# Altium footprint library kalios.PcbLib: 404 footprints (part 6 of 26)
Each footprint in its own frame and in the unit in brackets; x right, y up, seen from the top. Pads: shape width x height; smd on the part's side, far side on the other; paste and mask are expansions set on the pad; w line width, h text height; cw(c..) or ccw(c..) is an arc to the next point about the centre after c.
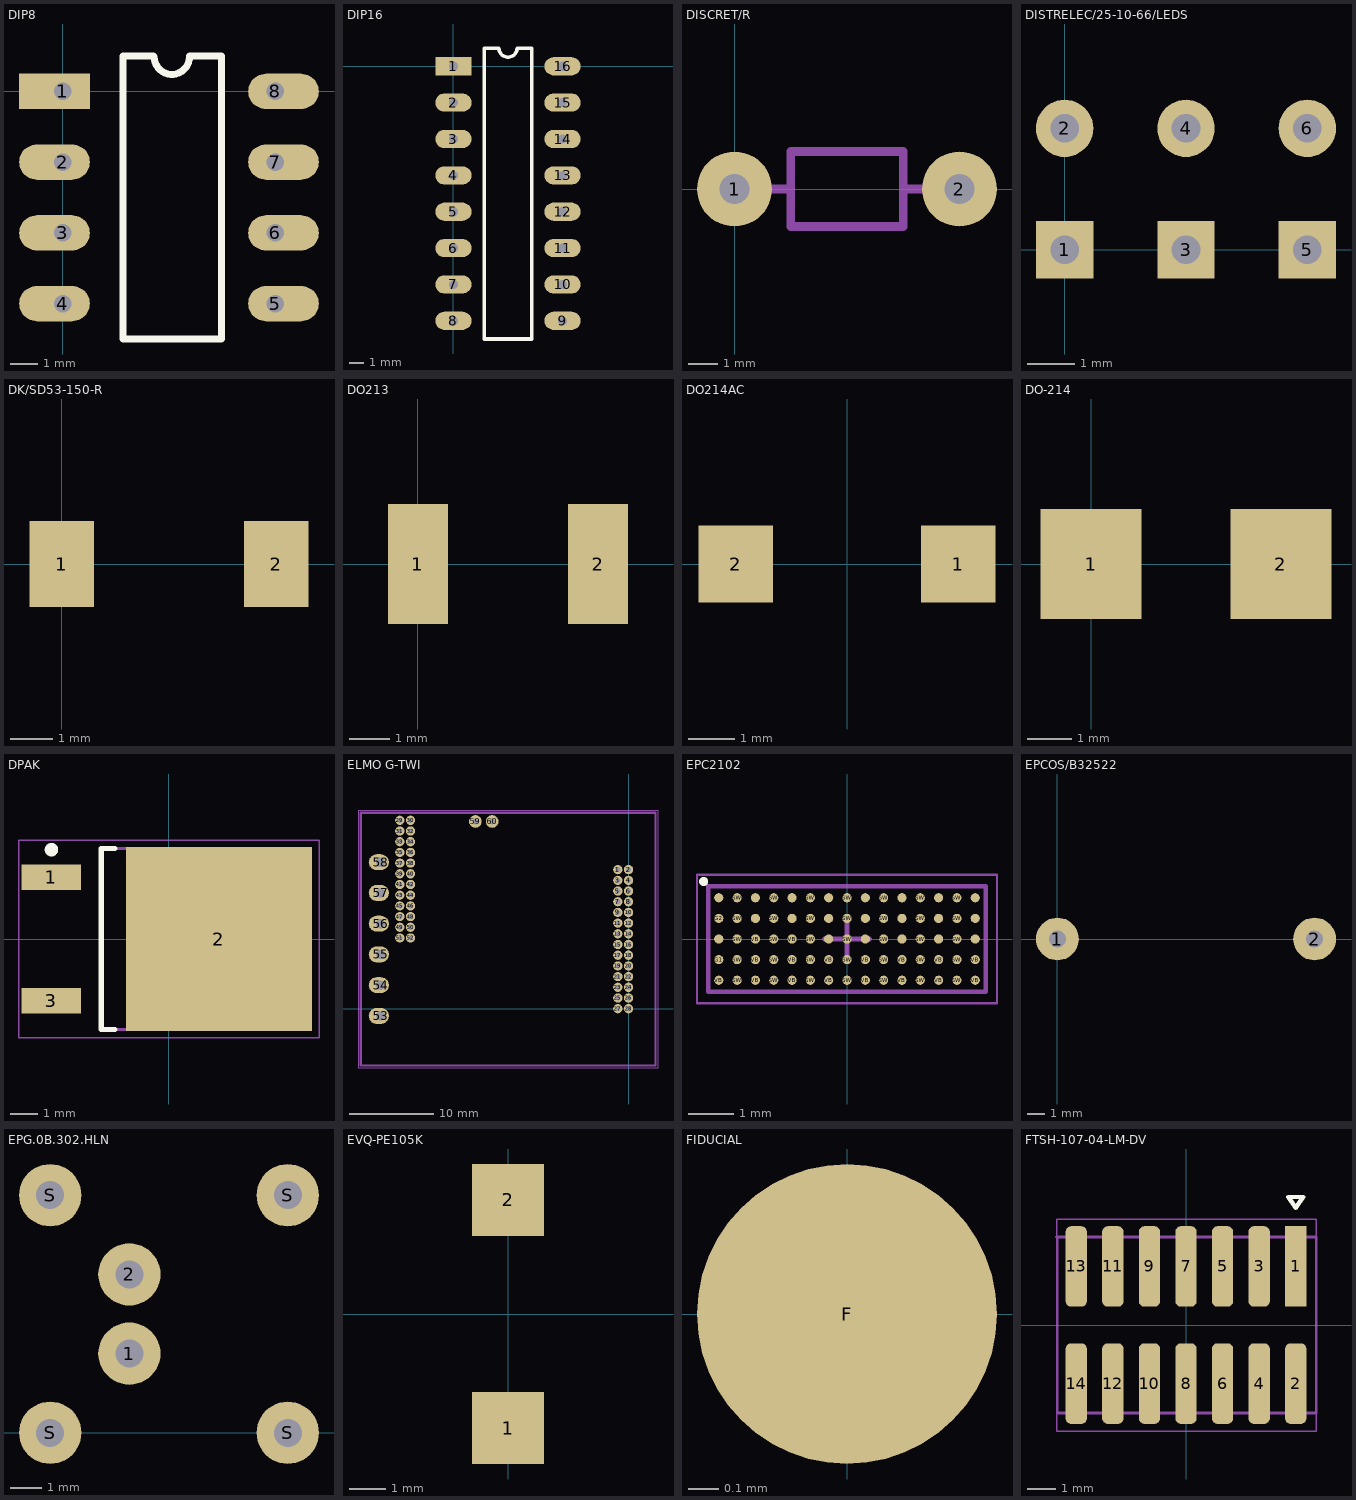
[diagram p5: the footprints below, top view; thin cyan lines are the x and y axes]

## DIP8 [mm]
pads (8):
  rect 2.54x1.27 hole 0.635 copper offset -0.3,0: 1(0,0)
  oval 2.54x1.27 hole 0.635 copper offset -0.3,0: 2(0,-2.54) 3(0,-5.08) 4(0,-7.62)
  oval 2.54x1.27 hole 0.635 copper offset 0.3,0: 5(7.62,-7.62) 6(7.62,-5.08) 7(7.62,-2.54) 8(7.62,0)
Top Overlay:
  lines w0.254: 3.251,1.27 2.159,1.27 2.159,-8.89 5.69,-8.89 5.69,1.27 ; 3.277,1.245 ccw(c3.912,1.245) 4.547,1.245 ; 4.547,1.27 5.639,1.27
Top Designator:
  text ".Designator" at -3.808,-4.318 h1.52
3D body "DIP8-SOCKET.STEP": height 8.36, standoff -4.46, extent -1.245,-8.763 8.814,1.295

## DIP16 [mm]
pads (16):
  rect 2.54x1.27 hole 0.635: 1(0,0)
  oval 2.54x1.27 hole 0.635: 2(0,-2.54) 3(0,-5.08) 4(0,-7.62) 5(0,-10.16) 6(0,-12.7) 7(0,-15.24) 8(0,-17.78) 9(7.62,-17.78) 10(7.62,-15.24) 11(7.62,-12.7) 12(7.62,-10.16) 13(7.62,-7.62) 14(7.62,-5.08) 15(7.62,-2.54) 16(7.62,0)
Top Overlay:
  lines w0.254: 2.159,-19.05 2.159,1.27 3.175,1.27 ccw(c3.81,1.27) 4.445,1.27 5.461,1.27 5.461,-19.05 2.159,-19.05
Top Designator:
  text ".Designator" at -3.858,-9.398 h1.52
3D body "DIP 16 socket 214.STEP": height 8.06, standoff -2.87, extent -1.491,-19.111 9.009,1.295

## DISCRET/R [mm]
pads (2):
  round 2.54 hole 1: 1(0,0) 2(7.62,0)
Top Courtyard:
  lines w0.3: 0,0 1.905,0 ; 5.715,0 7.62,0 ; 1.905,0 1.905,-1.27 5.715,-1.27 5.715,1.27 1.905,1.27 1.905,0
Top Designator:
  text ".Designator" at -3.808,-0.508 h1.52

## DISTRELEC/25-10-66/LEDS [mm]
pads (6):
  rect 1.2x1.2 hole 0.6 unplated: 1(0,0) 3(2.54,0) 5(5.08,0)
  round 1.2 hole 0.6 unplated: 2(0,2.54) 4(2.54,2.54) 6(5.08,2.54)
Top Designator:
  text ".Designator" at -0.104,0.753 h1.52
3D body "Leds.STEP": height 15.3, standoff -3.5, extent -2.007,-0.889 17.033,3.411

## DK/SD53-150-R [mm]
pads (2):
  rect 1.5x2 smd: 1(0,0) 2(5,0)
Top Designator:
  text ".Designator" at -5.118,-0.533 h1.52
3D body "SD53-150-R.STEP": height 2.8, standoff 0, extent 0.015,-2.525 5.115,2.475

## DO213 [mm]
pads (2):
  rect 1.5x3 smd: 1(0,0) 2(4.5,0)
Top Designator:
  text ".Designator" at -5.368,-0.508 h1.52
3D body "DO213.STEP": height 2.51, standoff 0, extent -0.25,-1.25 4.75,1.26

## DO214AC [mm]
pads (2):
  rect 1.6x1.67 smd: 1(2.4,0) 2(-2.4,0)
Top Designator:
  text ".Designator" at -7.618,-0.508 h1.52
3D body "DO214AC.STEP": height 2.17, standoff 0.03, extent -2.629,-1.333 2.477,1.334

## DO-214 [mm]
pads (2):
  rect 2.3x2.5 smd: 1(0,0) 2(4.318,0)
Top Designator:
  text ".Designator" at -5.459,-0.486 h1.52
3D body "DO-214.STEP": height 2.3, standoff 0, extent -0.414,-1.778 4.986,1.822

## DPAK [mm] "D-PAK, 3-Pads, Body 6.20x6.72mm (max), IPC Medium Density"
height 2.38
pads (3):
  rect 2.2x0.95 smd: 1(-4.35,2.28) 3(-4.35,-2.28)
  rect 6.9x6.8 smd: 2(1.85,0)
Top Overlay:
  circle w0.25: c-4.35,3.305 r0.125
  lines w0.2: -2,-3.35 -2.5,-3.35 -2.5,3.35 -2,3.35
Top 3D Body:
  lines w0.1: -2.5,-3.35 -2.5,3.35 3.7,3.35 3.7,-3.35 -2.5,-3.35
Top Courtyard:
  lines w0.05: -5.55,-3.65 -5.55,3.65 5.55,3.65 5.55,-3.65 -5.55,-3.65
  lines w0.1: -0.5,0 0.5,0 ; 0,-0.5 0,0.5
Top Designator:
  text ".Designator" at -7.618,-0.508 h1.52
3D body "DPAK.STEP": height 2.34, standoff -0.07, extent -4.845,-3.27 5.093,3.27

## ELMO G-TWI [mm] "ELMO Gold Twitter Motion Contgrol (Bottom Side)"
pads (60):
  round 1.1 / inner round 0.762 / far side round 1.1 hole 0.6: 1(-1.27,16.51) 2(0,16.51) 3(-1.27,15.24) 4(0,15.24) 5(-1.27,13.97) 6(0,13.97) 7(-1.27,12.7) 8(0,12.7) 9(-1.27,11.43) 10(0,11.43) 11(-1.27,10.16) 12(0,10.16) 13(-1.27,8.89) 14(0,8.89) 15(-1.27,7.62) 16(0,7.62) 17(-1.27,6.35) 18(0,6.35) 19(-1.27,5.08) 20(0,5.08) 21(-1.27,3.81) 22(0,3.81) 23(-1.27,2.54) 24(0,2.54) 25(-1.27,1.27) 26(0,1.27) 27(-1.27,0) 28(0,0) 29(-27.16,22.37) 30(-25.89,22.37) 31(-27.16,21.1) 32(-25.89,21.1) 33(-27.16,19.83) 34(-25.89,19.83) 35(-27.16,18.56) 36(-25.89,18.56) 37(-27.16,17.29) 38(-25.89,17.29) 39(-27.16,16.02) 40(-25.89,16.02) 41(-27.16,14.75) 42(-25.89,14.75) 43(-27.16,13.48) 44(-25.89,13.48) 45(-27.16,12.21) 46(-25.89,12.21) 47(-27.16,10.94) 48(-25.89,10.94) 49(-27.16,9.67) 50(-25.89,9.67) 51(-27.16,8.4) 52(-25.89,8.4)
  oval 2.4x1.9 hole 1.1 copper offset -0.203,0: 53(-29.45,-0.86) 54(-29.45,2.79) 55(-29.45,6.44) 56(-29.45,10.09) 57(-29.45,13.74) 58(-29.45,17.39)
  round 1.5 hole 0.7: 59(-18.19,22.23) 60(-16.19,22.23)
Top Assembly (Mech11):
  lines w0.254: -31.801,-6.731 3.2,-6.731 3.2,23.266 -31.801,23.266 -31.801,-6.731
Top 3D Body:
  lines w0.254: -31.801,-6.731 3.2,-6.731 3.2,23.266 -31.801,23.266 -31.801,-6.731
Bottom Courtyard:
  lines w0.05: -32.125,-7.025 -32.125,23.575 3.5,23.575 3.5,-7.025 -32.125,-7.025
Top Designator:
  text ".Designator" at -21.93,7.767 h1.52
3D body "G-TWI.SLDPRT": height 6.22, standoff -12.62, extent -31.802,-6.744 3.198,23.256

## EPC2102 [mm] "BGA, 75-Leads, Body 6.05x2.30mmx0.63mm, Pitch 0.40mm"
height 0.63
pads (75):
  round 0.2 smd: G1(-2.8,-0.45) G2(-2.8,0.45) GND(-2.8,0.9) GND(-2,0.45) GND(-2,0.9) GND(-1.2,0.45) GND(-1.2,0.9) GND(-0.4,0) GND(-0.4,0.45) GND(-0.4,0.9) GND(0.4,0) GND(0.4,0.45) GND(0.4,0.9) GND(1.2,0) GND(1.2,0.45) GND(1.2,0.9) GND(2,0) GND(2,0.45) GND(2,0.9) GND(2.8,0) GND(2.8,0.45) GND(2.8,0.9) GR1(-2.8,0) SW(-2.4,-0.9) SW(-2.4,-0.45) SW(-2.4,0) SW(-2.4,0.45) SW(-2.4,0.9) SW(-1.6,-0.9) SW(-1.6,-0.45) SW(-1.6,0) SW(-1.6,0.45) SW(-1.6,0.9) SW(-0.8,-0.9) SW(-0.8,-0.45) SW(-0.8,0) SW(-0.8,0.45) SW(-0.8,0.9) SW(0,-0.9) SW(0,-0.45) SW(0,0) SW(0,0.45) SW(0,0.9) SW(0.8,-0.9) SW(0.8,-0.45) SW(0.8,0) SW(0.8,0.45) SW(0.8,0.9) SW(1.6,-0.9) SW(1.6,-0.45) SW(1.6,0) SW(1.6,0.45) SW(1.6,0.9) SW(2.4,-0.9) SW(2.4,-0.45) SW(2.4,0) SW(2.4,0.45) SW(2.4,0.9) VB(-2.8,-0.9) VB(-2,-0.9) VB(-2,-0.45) VB(-2,0) VB(-1.2,-0.9) VB(-1.2,-0.45) VB(-1.2,0) VB(-0.4,-0.9) VB(-0.4,-0.45) VB(0.4,-0.9) VB(0.4,-0.45) VB(1.2,-0.9) VB(1.2,-0.45) VB(2,-0.9) VB(2,-0.45) VB(2.8,-0.9) VB(2.8,-0.45)
Top Overlay:
  circle w0.1: c-3.13,1.255 r0.05
Top 3D Body:
  lines w0.1: -3.025,-1.15 3.025,-1.15 3.025,1.15 -3.025,1.15 -3.025,-1.15
Top Courtyard:
  lines w0.05: -3.275,-1.4 3.275,-1.4 3.275,1.4 -3.275,1.4 -3.275,-1.4
  lines w0.1: -0.5,0 0.5,0 ; 0,-0.5 0,0.5
3D body "EPC2102.STEP": height 0.77, standoff -0.01, extent -3.065,-1.118 3.015,1.182

## EPCOS/B32522 [mm]
pads (2):
  round 2.5 hole 1: 1(0,0) 2(15,0)
Top Designator:
  text ".Designator" at -0.124,-0.508 h1.52
3D body "B32522.STEP": height 11.2, standoff -2.1, extent -1.507,-2.5 16.493,2.5

## EPG.0B.302.HLN [mm]
pads (6):
  round 2 hole 0.9: 1(5.08,2.54) 2(5.08,5.08) S(2.54,0) S(2.54,7.62) S(10.16,0) S(10.16,7.62)
Top Designator:
  text ".Designator" at 4.422,3.234 h1.52
3D body "Lemo-epg-0b-3xx-hln.STEP": height 12.69, standoff -3, extent -0.36,-2.108 24.44,9.592

## EVQ-PE105K [mm]
pads (2):
  rect 2x2 smd: 1(0,-3.175) 2(0,3.175)
Top Designator:
  text ".Designator" at -7.643,-0.508 h1.52
3D body "EVQ-PE105K.STEP": height 5, standoff 0, extent -1.775,-3.625 1.725,3.575

## FIDUCIAL [mm] "Fiducial marker"
pads (1):
  round 1 smd paste+0 mask+0.5: F(0,0)
Top Designator:
  text ".Designator" at -7.618,-0.508 h1.52

## FTSH-107-04-LM-DV [mm]
pads (14):
  rect 0.74x2.795 smd: 1(3.81,2.032)
  rrect50% 0.74x2.795 smd: 2(3.81,-2.032) 3(2.54,2.032) 4(2.54,-2.032) 5(1.27,2.032) 6(1.27,-2.032) 7(0,2.033) 8(0,-2.033) 9(-1.27,2.032) 10(-1.27,-2.032) 11(-2.54,2.032) 12(-2.54,-2.032) 13(-3.81,2.032) 14(-3.81,-2.032)
Top Overlay:
  lines w0.152: 3.556,4.445 4.064,4.445 3.81,4.064 3.556,4.445
Top 3D Body:
  lines w0.1: -4.496,3.05 4.521,3.05 4.521,-3.048 -4.47,-3.048 -4.47,3.05 4.496,3.05
Top Courtyard:
  lines w0.05: -4.496,-3.68 -4.496,3.68 4.521,3.68 4.521,-3.68 -4.496,-3.68
3D body "FTSH-107-04-LM-DV--3DModel-STEP-56544.STEP": height 6.72, standoff -0.01, extent -4.445,-2.972 4.445,2.87